# Altium integrated library ZJUD_MainBoard-V2.1.IntLib: 17 symbols
Pins are listed as number, name and electrical type; pins without a type are passive.

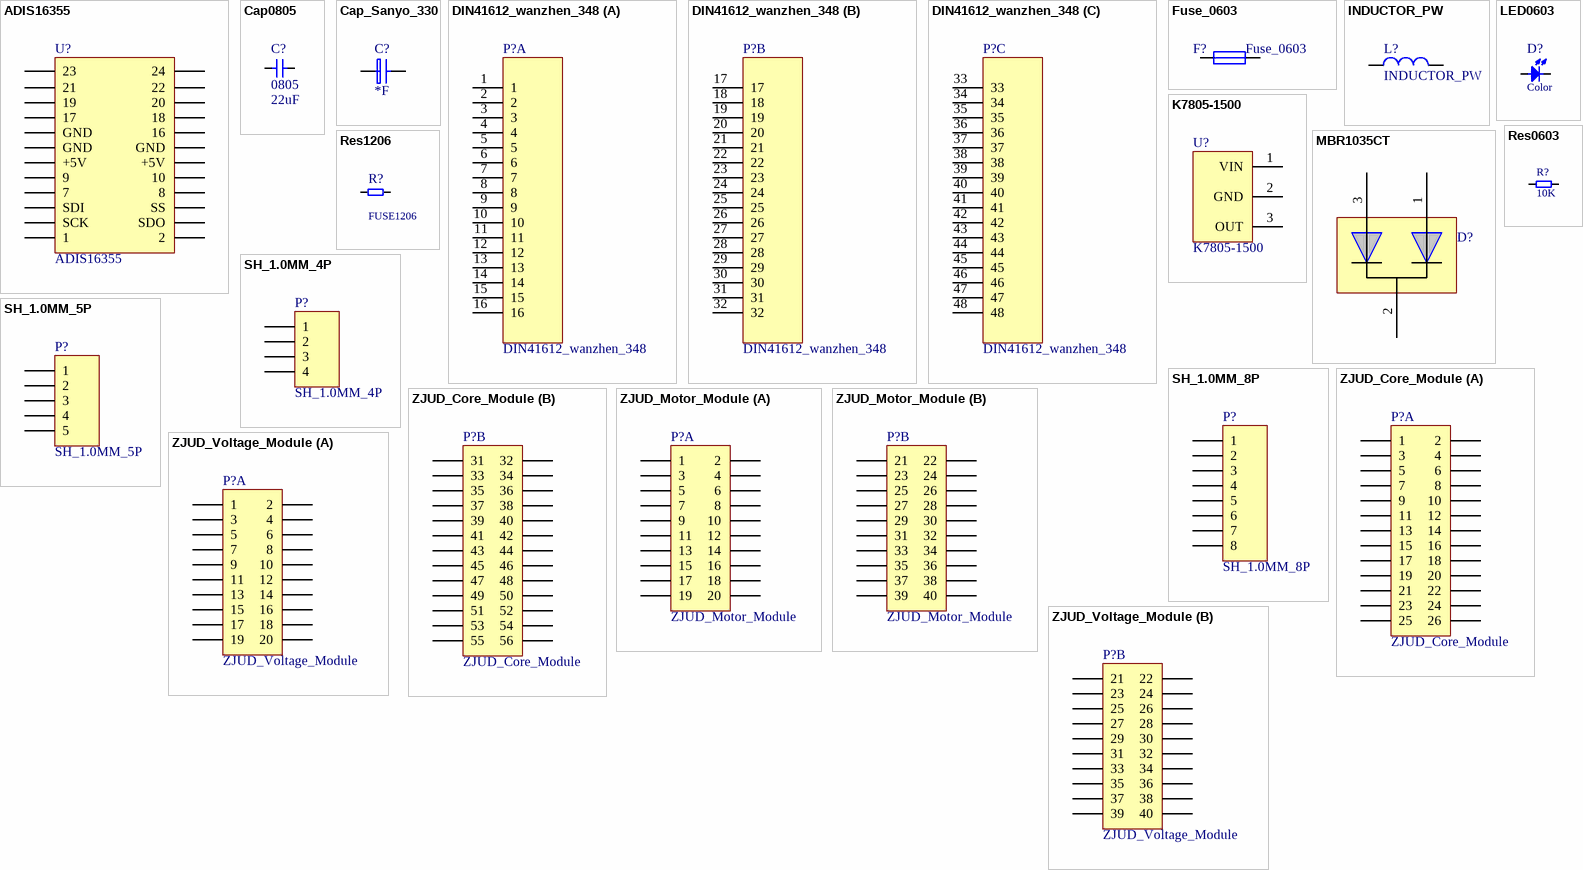
[diagram p0: symbols ADIS16355 to ZJUD_Voltage_Module]

## ADIS16355
designator U?
footprint ADIS16355
pins: 1, 2, 3 SCK, 4 SDO, 5 SDI, 6 SS, 7, 8, 9, 10, 11 +5V, 12 +5V, 13 GND, 14 GND, 15 GND, 16, 17, 18, 19, 20, 21, 22, 23, 24

## Cap0805
designator C?, comment 0805  value 22uF
footprint 0805C (0805贴片电阻)
pins: 1, 2

## Cap_Sanyo_330
designator C?  value *F  (hidden comment: Cap_Sanyo_330)
Manufacturer: Generic Components; Class: Passive; SubClass: Capacitor; Published: 08/06/2000; Publisher: Altium Hobart Technology Centre
footprint CAP_SANYO_330 (贴片电解电容)
footprint 1206
pins: 1, 2

## DIN41612_wanzhen_348
designator P?
LatestRevisionDate: 17-Jul-2002; LatestRevisionNote: Re-released for DXP Platform.; Publisher: Altium Limited
footprint DIN41612_wanzhen_348 (DIN41612连接器弯针2*24)
signal-integrity model Connector
part A pins: 1, 2, 3, 4, 5, 6, 7, 8, 9, 10, 11, 12, 13, 14, 15, 16
part B pins: 17, 18, 19, 20, 21, 22, 23, 24, 25, 26, 27, 28, 29, 30, 31, 32
part C pins: 33, 34, 35, 36, 37, 38, 39, 40, 41, 42, 43, 44, 45, 46, 47, 48

## Fuse_0603
designator F?
Code_IEC: 1005; Value: BLM21PG121SN1; Published: 8-Jun-2000; LatestRevisionDate: 29-May-2009; LatestRevisionNote: IPC-7351 Footprint Added.; PackageReference: 0402-A; Publisher: Altium Limited; PackageDescription: Chip Inductor; Code_JEITA: 0402
footprint 0603Fuse (0603贴片保险丝)
footprint INDC1608L (Chip Inductor, Body 1.6x0.8mm, IPC High Density)
footprint 2029 (Chip Inductor, Body 2.0x1.2mm, IPC High Density)
footprint 0603 (Chip Inductor, Body 0.6x0.3mm, IPC High Density)
footprint INDC3216 (Chip Inductor, Body 3.2x1.6mm, IPC High Density)
footprint INDC4532 (Chip Inductor, Body 4.5x3.2mm, IPC High Density)
simulation model INDUCTOR (Inductor)
signal-integrity model Inductor
pins: 1, 2

## INDUCTOR_PW
designator L?
footprint INDUCTOR_PW_1207
pins: 1, 2

## K7805-1500
designator U?
Published: 8-Jun-2000; LatestRevisionDate: 17-Jul-2002; LatestRevisionNote: Re-released for DXP Platform.; PackageVersion: Sep-1996; PackageReference: SMC; Publisher: Altium Limited; PackageDescription: DO-214-AB/SMC; 2 C-Bend Leads; Body 7.9 x 5.9 mm, inc. leads (LxW); Code_JEDEC: DO-214-AB
footprint K78X6-1500(L)
simulation model DIODE (Diode)
signal-integrity model Diode
pins: 1 VIN, 2 GND, 3 OUT

## LED0603
designator D?  value Color  (hidden comment: LED0603)
footprint 0603Led (0603贴片LED)
pins: 1, 2

## MBR1035CT
designator D?, comment 30CTQ80-S  (value not drawn)
footprint D2PAK
footprint D2PAK
footprint D2PAK
pins: 1, 2, 3

## Res0603
designator R?, comment value 10K  (hidden comment: Rb)
footprint 0603R (0603贴片电阻)
pins: 1, 2

## Res1206
designator R?, comment value FUSE1206  (hidden comment: Rd)
footprint 1206R (自恢复保险丝1206封装)
pins: 1, 2

## SH_1.0MM_4P
designator P?
LatestRevisionDate: 17-Jul-2002; LatestRevisionNote: Re-released for DXP Platform.; Publisher: Altium Limited
footprint SH_1.0MM_4P
signal-integrity model Connector
pins: 1, 2, 3, 4

## SH_1.0MM_5P
designator P?
LatestRevisionDate: 17-Jul-2002; LatestRevisionNote: Re-released for DXP Platform.; Publisher: Altium Limited
footprint SH_1.0MM_5P (Footprint not found)
signal-integrity model Connector
pins: 1, 2, 3, 4, 5

## SH_1.0MM_8P
designator P?
LatestRevisionDate: 17-Jul-2002; LatestRevisionNote: Re-released for DXP Platform.; Publisher: Altium Limited
footprint SH_1.0MM_8P
signal-integrity model Connector
pins: 1, 2, 3, 4, 5, 6, 7, 8

## ZJUD_Core_Module
designator P?
LatestRevisionDate: 17-Jul-2002; LatestRevisionNote: Re-released for DXP Platform.; Publisher: Altium Limited
footprint ZJUD_Core_Module
signal-integrity model Connector
part A pins: 1, 2, 3, 4, 5, 6, 7, 8, 9, 10, 11, 12, 13, 14, 15, 16, 17, 18, 19, 20, 21, 22, 23, 24, 25, 26
part B pins: 31, 32, 33, 34, 35, 36, 37, 38, 39, 40, 41, 42, 43, 44, 45, 46, 47, 48, 49, 50, 51, 52, 53, 54, 55, 56

## ZJUD_Motor_Module
designator P?
LatestRevisionDate: 17-Jul-2002; LatestRevisionNote: Re-released for DXP Platform.; Publisher: Altium Limited
footprint ZJUD_Motor_Module
signal-integrity model Connector
part A pins: 1, 2, 3, 4, 5, 6, 7, 8, 9, 10, 11, 12, 13, 14, 15, 16, 17, 18, 19, 20
part B pins: 21, 22, 23, 24, 25, 26, 27, 28, 29, 30, 31, 32, 33, 34, 35, 36, 37, 38, 39, 40

## ZJUD_Voltage_Module
designator P?
LatestRevisionDate: 17-Jul-2002; LatestRevisionNote: Re-released for DXP Platform.; Publisher: Altium Limited
footprint ZJUD_Voltage_Module
signal-integrity model Connector
part A pins: 1, 2, 3, 4, 5, 6, 7, 8, 9, 10, 11, 12, 13, 14, 15, 16, 17, 18, 19, 20
part B pins: 21, 22, 23, 24, 25, 26, 27, 28, 29, 30, 31, 32, 33, 34, 35, 36, 37, 38, 39, 40